# Altium footprint library DIP Connector.PcbLib: 69 footprints (part 5 of 5)
Each footprint in its own frame and in the unit in brackets; x right, y up, seen from the top. Pads: shape width x height; smd on the part's side, far side on the other; paste and mask are expansions set on the pad; w line width, h text height; cw(c..) or ccw(c..) is an arc to the next point about the centre after c.
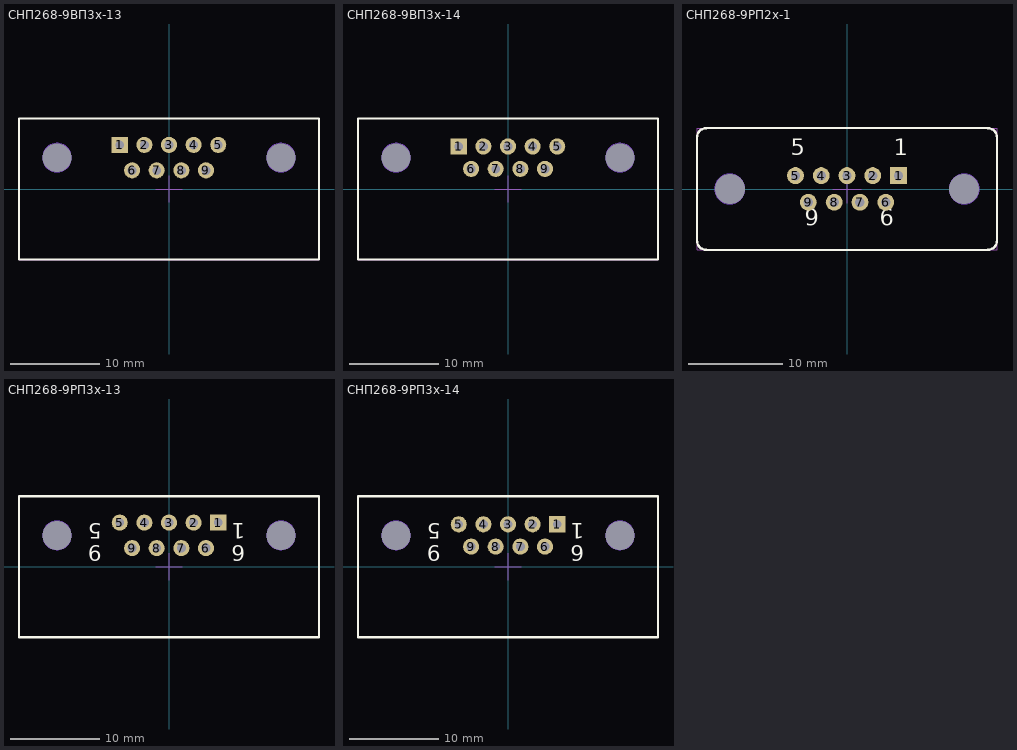
[diagram p4: the footprints below, top view; thin cyan lines are the x and y axes]

## СНП268-9ВП3x-13 [mm] "Прямоугольная вилка, 2,84mm между контактами"
height 20
pads (11):
  round 0.1 hole 3.2 unplated: 0(-12.5,3.5) 0(12.5,3.5)
  rect 1.8x1.8 hole 1: 1(-5.5,4.93)
  round 1.8 hole 1: 2(-2.75,4.93) 3(0,4.93) 4(2.75,4.93) 5(5.5,4.93) 6(-4.12,2.09) 7(-1.37,2.09) 8(1.38,2.09) 9(4.13,2.09)
Top Layer keep-out:
  circle w0.1: c-12.5,3.5 r1.6
  circle w0.1: c12.5,3.5 r1.6
Bottom Layer keep-out:
  circle w0.1: c-12.5,3.5 r1.6
  circle w0.1: c12.5,3.5 r1.6
Top Overlay:
  lines w0.25: -16.75,-7.875 -16.75,7.875 16.75,7.875 16.75,-7.875 -16.75,-7.875
Mechanical 15:
  lines w0.1: -1.5,0 1.5,0 ; 0,-1.5 0,1.5 ; -16.75,-7.875 -16.75,7.875 16.75,7.875 16.75,-7.875 -16.75,-7.875
3D body "210112043.stp": height 13.2, standoff -3.6, extent -15.4,-14.2 15.4,7.5

## СНП268-9ВП3x-14 [mm] "Прямоугольная вилка, 2,5mm между контактами"
height 20
pads (11):
  round 0.1 hole 3.2 unplated: 0(-12.5,3.5) 0(12.5,3.5)
  rect 1.8x1.8 hole 1: 1(-5.5,4.75)
  round 1.8 hole 1: 2(-2.75,4.75) 3(0,4.75) 4(2.75,4.75) 5(5.5,4.75) 6(-4.12,2.25) 7(-1.37,2.25) 8(1.38,2.25) 9(4.13,2.25)
Top Layer keep-out:
  circle w0.1: c-12.5,3.5 r1.6
  circle w0.1: c12.5,3.5 r1.6
Bottom Layer keep-out:
  circle w0.1: c-12.5,3.5 r1.6
  circle w0.1: c12.5,3.5 r1.6
Top Overlay:
  lines w0.25: -16.75,-7.875 16.75,-7.875 16.75,7.875 -16.75,7.875 -16.75,-7.875
Mechanical 15:
  lines w0.1: -1.5,0 1.5,0 ; 0,-1.5 0,1.5 ; -16.75,-7.875 16.75,-7.875 16.75,7.875 -16.75,7.875 -16.75,-7.875
3D body "210112043.stp": height 13.2, standoff -3.6, extent -15.4,-14.2 15.4,7.5

## СНП268-9РП2x-1 [mm] "Прямая розетка, 2,84mm между контактами"
height 20
pads (11):
  round 0.1 hole 3.2 unplated: 0(-12.5,0) 0(12.5,0)
  rect 1.8x1.8 hole 1: 1(5.5,1.43)
  round 1.8 hole 1: 2(2.75,1.43) 3(0,1.43) 4(-2.75,1.43) 5(-5.5,1.43) 6(4.13,-1.41) 7(1.38,-1.41) 8(-1.37,-1.41) 9(-4.12,-1.41)
Top Layer keep-out:
  circle w0.1: c12.5,0 r1.6
  circle w0.1: c-12.5,0 r1.6
Bottom Layer keep-out:
  circle w0.1: c-12.5,0 r1.6
  circle w0.1: c12.5,0 r1.6
Top Overlay:
  lines w0.25: -16,-5.5 -16,5.5 ; -15,-6.5 15,-6.5 ; -15,6.5 15,6.5 ; 16,-5.5 16,5.5
  lines w0.254: -16,-5.5 ccw(c-15,-5.5) -15,-6.5 ; -16,5.5 cw(c-15,5.5) -15,6.5 ; 15,-6.5 ccw(c15,-5.5) 16,-5.5 ; 15,6.5 cw(c15,5.5) 16,5.5
  text "6" at 3.5,-4.5 h3
  text "9" at -4.5,-4.5 h3
  text "1" at 5,3 h3
  text "5" at -6,3 h3
Bottom Overlay:
  text "6" at 4.5,-4.5 h3
  text "9" at -3.5,-4.5 h3
  text "1" at 6,3 h3
  text "5" at -5,3 h3
Mechanical 15:
  lines w0.1: -1.5,0 1.5,0 ; 0,-1.5 0,1.5 ; -16,-6.5 -16,6.5 16,6.5 16,-6.5 -16,-6.5
3D body "D-Sub-K122434007-Stig-Wahlstrom.step": height 14.5, standoff -1.7, extent -15.405,-6.25 15.405,6.25

## СНП268-9РП3x-13 [mm] "Прямоугольная розетка, 2,84mm между контактами"
height 20
pads (11):
  round 0.1 hole 3.2 unplated: 0(-12.5,3.5) 0(12.5,3.5)
  rect 1.8x1.8 hole 1: 1(5.5,4.93)
  round 1.8 hole 1: 2(2.75,4.93) 3(0,4.93) 4(-2.75,4.93) 5(-5.5,4.93) 6(4.13,2.09) 7(1.38,2.09) 8(-1.37,2.09) 9(-4.12,2.09)
Top Layer keep-out:
  circle w0.1: c-12.5,3.5 r1.6
  circle w0.1: c12.5,3.5 r1.6
Bottom Layer keep-out:
  circle w0.1: c-12.5,3.5 r1.6
  circle w0.1: c12.5,3.5 r1.6
Top Overlay:
  lines w0.25: -16.75,-7.875 -16.75,7.875 16.75,7.875 16.75,-7.875 -16.75,-7.875
  text "1" at 8.5,5.5 h3
  text "6" at 8.5,3 h3
  text "9" at -7.5,3 h3
  text "5" at -7.5,5.5 h3
Bottom Overlay:
  text "1" at 7.5,5.5 h3
  text "6" at 7.5,3 h3
  text "9" at -8.5,3 h3
  text "5" at -8.5,5.5 h3
Mechanical 15:
  lines w0.1: -1.5,0 1.5,0 ; 0,-1.5 0,1.5 ; -16.75,-7.875 -16.75,7.875 16.75,7.875 16.75,-7.875 -16.75,-7.875
3D body "182-009-213.STEP": height 12.55, standoff -3.17, extent -15.405,-12.075 15.405,7

## СНП268-9РП3x-14 [mm] "Прямоугольная розетка, 2,5mm между контактами"
height 20
pads (11):
  round 0.1 hole 3.2 unplated: 0(-12.5,3.5) 0(12.5,3.5)
  rect 1.8x1.8 hole 1: 1(5.5,4.75)
  round 1.8 hole 1: 2(2.75,4.75) 3(0,4.75) 4(-2.75,4.75) 5(-5.5,4.75) 6(4.13,2.25) 7(1.38,2.25) 8(-1.37,2.25) 9(-4.12,2.25)
Top Layer keep-out:
  circle w0.1: c-12.5,3.5 r1.6
  circle w0.1: c12.5,3.5 r1.6
Bottom Layer keep-out:
  circle w0.1: c-12.5,3.5 r1.6
  circle w0.1: c12.5,3.5 r1.6
Top Overlay:
  lines w0.25: -16.75,-7.875 16.75,-7.875 16.75,7.875 -16.75,7.875 -16.75,-7.875
  text "5" at -7.5,5.5 h3
  text "9" at -7.5,3 h3
  text "6" at 8.5,3 h3
  text "1" at 8.5,5.5 h3
Bottom Overlay:
  text "5" at -8.5,5.5 h3
  text "9" at -8.5,3 h3
  text "6" at 7.5,3 h3
  text "1" at 7.5,5.5 h3
Mechanical 15:
  lines w0.1: -1.5,0 1.5,0 ; 0,-1.5 0,1.5 ; -16.75,-7.875 16.75,-7.875 16.75,7.875 -16.75,7.875 -16.75,-7.875
3D body "1634584-2.STEP": height 14.27, standoff -3.1, extent -15.4,-14.38 15.4,6.5